# Altium footprint library iot_switch.PcbLib: 27 footprints (part 1 of 2)
Each footprint in its own frame and in the unit in brackets; x right, y up, seen from the top. Pads: shape width x height; smd on the part's side, far side on the other; paste and mask are expansions set on the pad; w line width, h text height; cw(c..) or ccw(c..) is an arc to the next point about the centre after c.
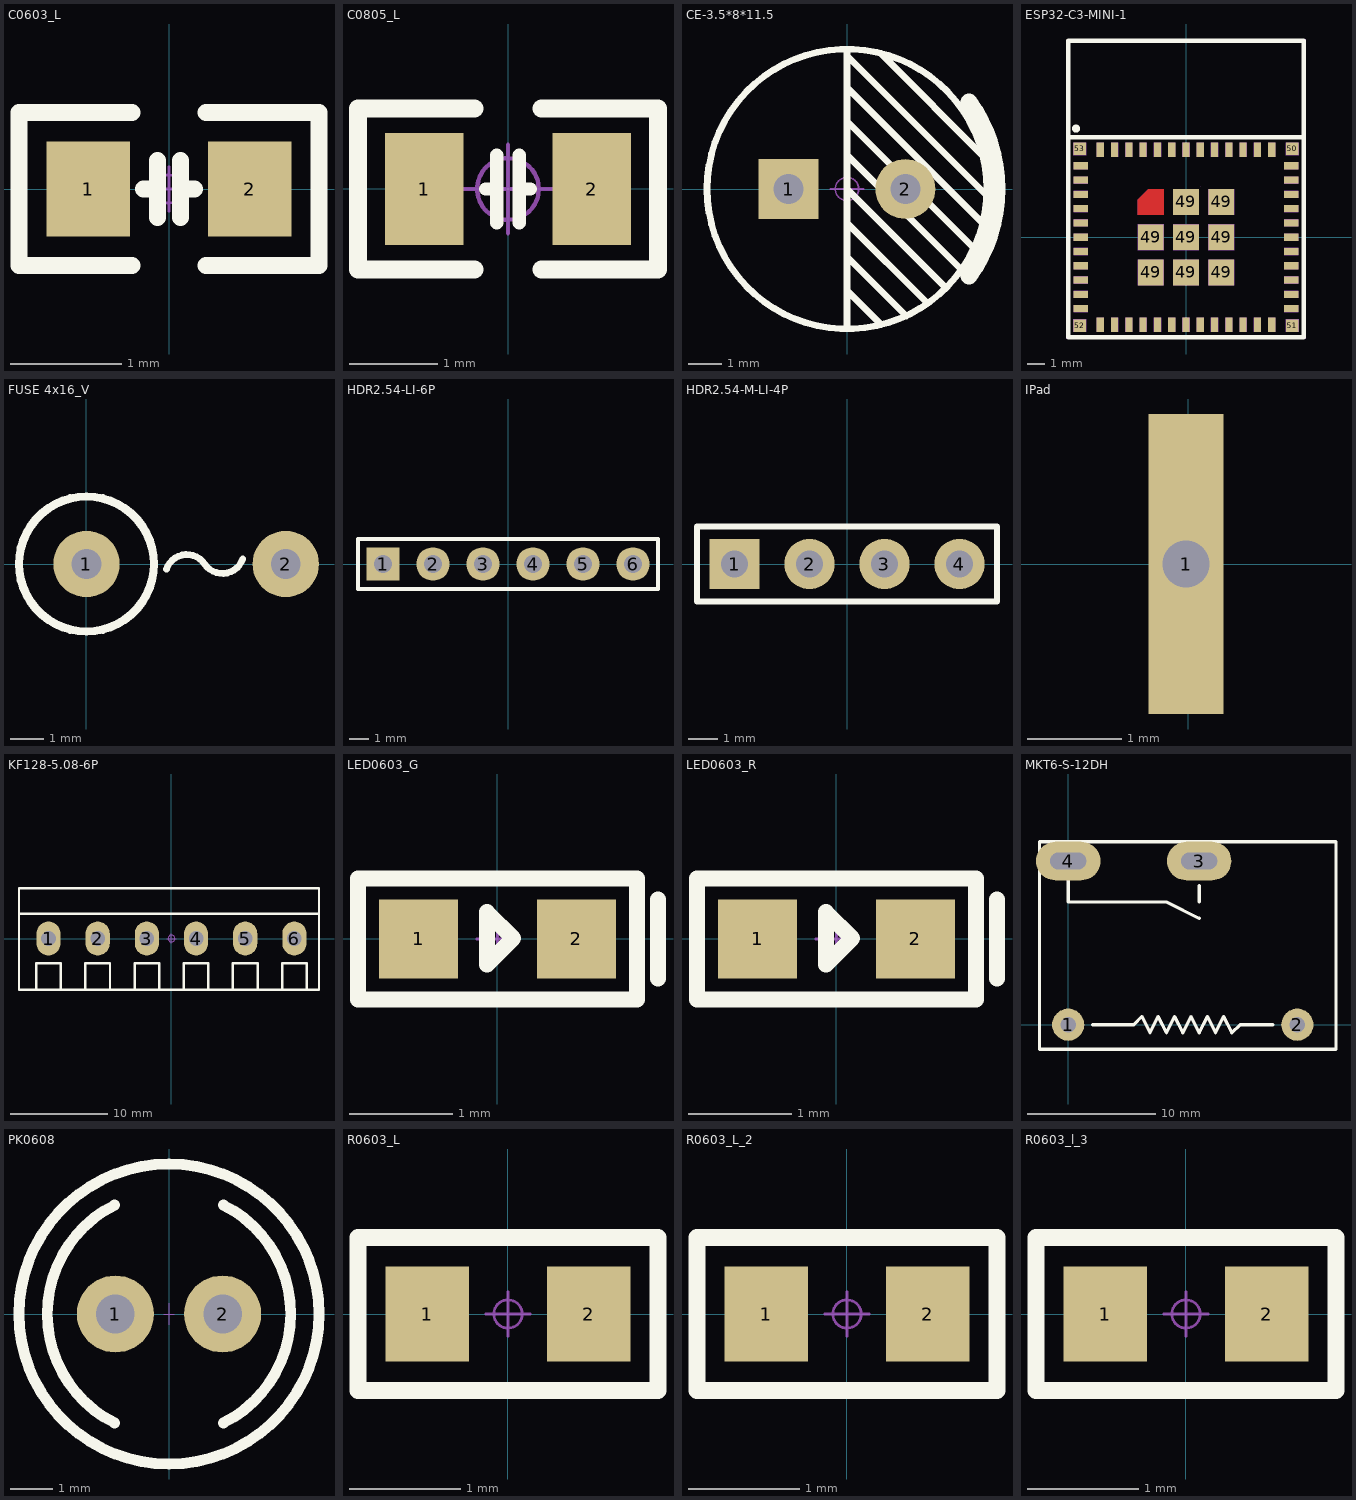
[diagram p0: the footprints below, top view; thin cyan lines are the x and y axes]

## C0603_L [mm] "贴片MLCC电容"
pads (2):
  rect 0.75x0.85 smd: 1(-0.725,0) 2(0.725,0)
Top Overlay:
  lines w0.152: -0.33,-0.686 -1.346,-0.686 -1.346,0.686 -0.33,0.686 ; -0.229,0 -0.102,0 ; -0.102,-0.254 -0.102,0.254 ; 0.102,-0.254 0.102,0.254 ; 0.102,0 0.229,0 ; 0.33,-0.686 1.346,-0.686 1.346,0.686 0.33,0.686
Mechanical 15:
  circle w0.025: c0,0 r0.127
  lines w0.025: -0.2,0 0.2,0 ; 0,-0.2 0,0.2
3D body "C0603H08-2S.stp": height 0.8, standoff 0, extent -0.8,-0.4 0.8,0.4

## C0805_L [mil] "贴片MLCC电容"
height 19.68
pads (2):
  rect 35x50 smd: 1(-37.4,0) 2(37.4,0)
Top Overlay:
  lines w6: -10,0 -5,0 ; -5,-15 -5,15 ; 5,-15 5,15 ; 5,0 10,0
  lines w8: -15,-36 -66.93,-36 -66.93,36 -15,36 ; 15,-36 66.93,-36 66.93,36 15,36
Mechanical 15:
  circle w1.97: c0,0 r13.78
  circle w1.97: c0,0 r13.78
  lines w1.97: -19.68,0 19.68,0 -19.68,0 ; 0,-19.68 0,19.68 0,-19.68
3D body "C0805H13-2S.stp": height 51.18, standoff -0.04, extent -39.37,-25.59 39.37,25.59

## CE-3.5*8*11.5 [mm] "脚距3.5mm直径8mm高度11.5mm       联系卖家 免费人工查找封装"
pads (2):
  rect 1.8x1.8 hole 0.9: 1(-1.75,0)
  round 1.8 hole 0.9: 2(1.75,0)
Top Overlay:
  circle w0.2: c0,0 r4.2
  lines w0.2: 0,-4.191 0,4 ; 0,-3.048 1.016,-4.064 ; 0,-2.032 1.778,-3.81 ; 0,-1.016 2.413,-3.429 ; 0,0 2.921,-2.921 ; 0,1.016 3.429,-2.413 ; 0,2.032 3.81,-1.778 ; 0,3.048 4.064,-1.016 ; 0,4.191 0,4 ; 1.016,4.064 4.191,0.889 ; 4.191,-0.127 4.127,-0.127 0,4
  lines w0.504: 3.663,-2.616 ccw(c0,0) 3.663,2.616
Mechanical 15:
  circle w0.05: c0,0 r0.35
  lines w0.05: -0.5,0 0.5,0 ; 0,-0.5 0,0.5
3D body "CE_TH_3.5x8x11.5.STEP": height 11.64, standoff -3.27, extent -4,-3.999 4.01,4

## ESP32-C3-MINI-1 [mm]
pads (60):
  rect 0.8x0.4 smd paste+0 mask+0.051: 1(-5.917,4.012) 2(-5.917,3.212) 3(-5.917,2.412) 4(-5.917,1.612) 5(-5.917,0.812) 6(-5.917,0.012) 7(-5.917,-0.788) 8(-5.917,-1.588) 9(-5.917,-2.388) 10(-5.917,-3.188) 11(-5.917,-3.988) 25(5.883,-3.988) 26(5.883,-3.188) 27(5.883,-2.388) 28(5.883,-1.588) 29(5.883,-0.788) 30(5.883,0.012) 31(5.883,0.812) 32(5.883,1.612) 33(5.883,2.412) 34(5.883,3.212) 35(5.883,4.012)
  rect 0.4x0.8 smd paste+0 mask+0.051: 12(-4.817,-4.888) 13(-4.017,-4.888) 14(-3.217,-4.888) 15(-2.417,-4.888) 16(-1.617,-4.888) 17(-0.817,-4.888) 18(-0.017,-4.888) 19(0.783,-4.888) 20(1.583,-4.888) 21(2.383,-4.888) 22(3.183,-4.888) 23(3.983,-4.888) 24(4.783,-4.888) 36(4.783,4.912) 37(3.983,4.912) 38(3.183,4.912) 39(2.383,4.912) 40(1.583,4.912) 41(0.783,4.912) 42(-0.017,4.912) 43(-0.817,4.912) 44(-1.617,4.912) 45(-2.417,4.912) 46(-3.217,4.912) 47(-4.017,4.912) 48(-4.817,4.912)
  rect 1.45x1.45 smd paste+0 mask+0.051: 49(-1.992,-1.963) 49(-1.992,0.012) 49(-0.017,-1.963) 49(-0.017,0.012) 49(-0.017,1.987) 49(1.958,-1.963) 49(1.958,0.012) 49(1.958,1.987)
  rect 0.7x0.7 smd paste+0 mask+0.051: 50(5.933,4.962) 51(5.933,-4.938) 52(-5.967,-4.938) 53(-5.967,4.962)
Top Layer:
  region: -2.717,2.112 -2.117,2.712 -1.267,2.712 -1.267,1.262 -2.717,1.262 -2.717,2.112
Top Overlay:
  lines w0.254: -6.617,5.612 6.583,5.612 ; -6.177,5.996 cw(c-6.172,6.096) -6.172,5.996 ; -6.617,-5.588 6.583,-5.588 6.583,11.012 -6.617,11.012 -6.617,-5.588
Mechanical 1:
  drawing of 68 lines, arcs and shapes, not listed
Mechanical 15:
  lines w0.003: 0.789,2.839 0.79,2.839
3D body "ESP32-C3-MINI-1 3D Model.STEP": height 2.4, standoff 0, extent -6.647,-5.563 6.553,11.037

## FUSE 4x16_V [mm] "4*16mm(直径，脚距）         淘宝ID:黄晶宝石"
pads (2):
  round 2 hole 0.9: 1(0,0) 2(6,0)
Top Overlay:
  circle w0.254: c0,0 r2.032
  lines w0.203: 2.406,-0.156 cw(c3.019,-0.362) 3.556,0 ccw(c4.093,0.362) 4.706,0.156
3D body "FU_4x16_v.STEP": height 13.1, standoff -3.5, extent -2,-1.997 6.3,1.997

## HDR2.54-LI-6P [mm] "排针，6脚                        联系卖家 免费查找封装"
pads (6):
  rect 1.7x1.7 hole 0.9: 1(-6.35,0)
  round 1.7 hole 0.9: 2(-3.81,0) 3(-1.27,0) 4(1.27,0) 5(3.81,0) 6(6.35,0)
Top Overlay:
  lines w0.2: -7.62,-1.27 7.62,-1.27 7.62,1.27 -7.62,1.27 -7.62,-1.27
3D body "HDR2.54-1P.STEP": height 2.54, standoff -8.96, extent -7.62,-1.27 -5.08,1.27
3D body "HDR2.54-1P.STEP": height 2.54, standoff -8.96, extent -5.08,-1.27 -2.54,1.27
3D body "HDR2.54-1P.STEP": height 2.54, standoff -8.96, extent -2.54,-1.27 0,1.27
3D body "HDR2.54-1P.STEP": height 2.54, standoff -8.96, extent 0,-1.27 2.54,1.27
3D body "HDR2.54-1P.STEP": height 2.54, standoff -8.96, extent 2.54,-1.27 5.08,1.27
3D body "HDR2.54-1P.STEP": height 2.54, standoff -8.96, extent 5.08,-1.27 7.62,1.27

## HDR2.54-M-LI-4P [mm] "排母，4脚"
pads (4):
  rect 1.7x1.7 hole 0.9: 1(-3.81,0)
  round 1.7 hole 0.9: 2(-1.27,0) 3(1.27,0) 4(3.81,0)
Top Overlay:
  lines w0.2: -5.08,-1.27 5.08,-1.27 5.08,1.27 -5.08,1.27 -5.08,-1.27
3D body "HDR2.54-1P_M.STEP": height 8.5, standoff -3, extent -2.54,-1.27 0,1.27
3D body "HDR2.54-1P_M.STEP": height 8.5, standoff -3, extent -5.08,-1.27 -2.54,1.27
3D body "HDR2.54-1P_M.STEP": height 8.5, standoff -3, extent 2.54,-1.27 5.08,1.27
3D body "HDR2.54-1P_M.STEP": height 8.5, standoff -3, extent 0,-1.27 2.54,1.27

## IPad [mm]
height 1.8
pads (1):
  rect 0.8x3.2 hole 0.5 square: 1(-0.025,0)

## KF128-5.08-6P [mm] "螺钉式接线端子，脚距5.08mm"
pads (6):
  oval 2.5x3.5 hole 1.5: 1(-12.7,0) 2(-7.62,0) 3(-2.54,0) 4(2.54,0) 5(7.62,0) 6(12.7,0)
Top Overlay:
  lines w0.254: -15.748,2.54 15.24,2.54 ; -13.97,-5.309 -13.97,-2.54 -11.43,-2.54 -11.43,-5.309 ; -8.89,-5.309 -8.89,-2.54 -6.35,-2.54 -6.35,-5.309 ; -3.81,-5.309 -3.81,-2.54 -1.27,-2.54 -1.27,-5.309 ; 1.27,-5.309 1.27,-2.54 3.81,-2.54 3.81,-5.309 ; 6.35,-5.309 6.35,-2.54 8.89,-2.54 8.89,-5.309 ; 11.43,-5.309 11.43,-2.54 13.97,-2.54 13.97,-5.309 ; -15.748,-5.309 -15.748,5.207 15.24,5.207 15.24,-5.309 -15.748,-5.309
Mechanical 15:
  circle w0.05: c0,0 r0.35
  lines w0.05: -0.5,0 0.5,0 ; 0,-0.5 0,0.5
3D body "KF128-5.08.STEP": height 14.18, standoff -3.92, extent 9.66,-5.3 15.24,5.2
3D body "KF128-5.08.STEP": height 14.18, standoff -3.92, extent 4.58,-5.3 10.16,5.2
3D body "KF128-5.08.STEP": height 14.18, standoff -3.92, extent -0.5,-5.3 5.08,5.2
3D body "KF128-5.08.STEP": height 14.18, standoff -3.92, extent -5.58,-5.3 0,5.2
3D body "KF128-5.08.STEP": height 14.18, standoff -3.92, extent -10.66,-5.3 -5.08,5.2
3D body "KF128-5.08.STEP": height 14.18, standoff -3.92, extent -15.74,-5.3 -10.16,5.2

## LED0603_G [mil] "绿色0603LED"
pads (2):
  rect 30x30 smd: 1(-30,0) 2(30,0)
Top Overlay:
  lines w6: 61,-15 61,15 ; -53,-23 -53,23 53,23 53,-23 -53,-23 ; -4,-9.75 6,0.25 -4,10.25 -4,-9.75
Mechanical 15:
  circle w1: c0,0 r5
  lines w1: -7.87,0 7.87,0 ; 0,-7.87 0,7.87
3D body "LED_0603-G(1).STEP": height 18.36, standoff -0.04, extent -31.5,-15.79 31.5,15.79
3D body "LED 0603玻璃罩.": height 0, standoff 0, extent 0,0 0,0

## LED0603_R [mil] "红色0603LED"
pads (2):
  rect 30x30 smd: 1(-30,0) 2(30,0)
Top Overlay:
  lines w6: 61,-15 61,15 ; -53,-23 53,-23 53,23 -53,23 -53,-23 ; -4,-9.75 -4,10.25 6,0.25 -4,-9.75
Mechanical 15:
  circle w1: c0,0 r5
  lines w1: -7.88,0 7.87,0 ; 0,-7.88 0,7.87
3D body "LED 0603玻璃罩.": height 0, standoff 0, extent 0,0 0,0
3D body "LED_0603-R.STEP": height 18.36, standoff -0.04, extent -31.49,-15.78 31.5,15.8

## MKT6-S-12DH [mm] "单刀单投/常开"
pads (4):
  round 2.5 hole 1.2: 1(0,0) 2(17.78,0)
  oval 5x3 hole 1.3 slot 2.8 at 0 deg: 3(10.16,12.7) 4(0,12.7)
Top Overlay:
  lines w0.254: 0,11.43 0,9.525 6.985,9.525 7.62,9.525 10.16,8.255 ; 1.905,0 5.08,0 5.715,0.635 6.35,-0.635 6.985,0.635 7.62,-0.635 8.255,0.635 8.89,-0.635 9.525,0.635 10.16,-0.635 10.795,0.635 11.43,-0.635 12.065,0.635 12.7,-0.635 13.335,0 15.875,0 ; 10.16,9.525 10.16,10.795 ; -2.22,-1.9 -2.22,14.2 20.78,14.2 20.78,-1.9 -2.22,-1.9
3D body "MKtT-S-12DH.STEP": height 10.25, standoff -3.85, extent -2.24,-1.9 20.76,14.2

## PK0608 [mm] "2.5*7*10mm(脚距，直径，高）"
pads (2):
  round 1.8 hole 0.9: 1(-1.25,0) 2(1.25,0)
Top Overlay:
  circle w0.254: c0,0 r3.5
  lines w0.254: -1.27,-2.54 cw(c0,0) -1.27,2.54 ; 1.27,-2.54 ccw(c0,0) 1.27,2.54
Mechanical 15:
  lines w0.01: -0.127,0 0.127,0 ; 0,-0.254 0,0.254
3D body "PK0608.STEP": height 10.02, standoff -2.78, extent -3.5,-3.5 3.5,3.5

## R0603_L [mm] "1/10W贴片电阻"
height 1.8
pads (2):
  rect 0.75x0.85 smd: 1(-0.725,0) 2(0.725,0)
Top Overlay:
  lines w0.152: -1.346,-0.686 1.346,-0.686 1.346,0.686 -1.346,0.686 -1.346,-0.686
Mechanical 15:
  circle w0.025: c0,0 r0.127
  lines w0.025: -0.2,0 0.2,0 ; 0,-0.2 0,0.2
3D body "R0603-2.stp": height 0.4, standoff 0, extent -0.8,-0.4 0.8,0.4

## R0603_L_2 [mm]
pads (2):
  rect 0.75x0.85 smd: 1(-0.725,0) 2(0.725,0)
Top Overlay:
  lines w0.152: -1.346,-0.686 -1.346,0.686 1.346,0.686 1.346,-0.686 -1.346,-0.686
Mechanical 15:
  circle w0.025: c0,0 r0.127
  lines w0.025: -0.2,0 0.2,0 ; 0,-0.2 0,0.2
3D body "R0603-2.stp": height 0.4, standoff 0, extent -0.8,-0.4 0.8,0.4

## R0603_l_3 [mm]
pads (2):
  rect 0.75x0.85 smd: 1(-0.725,0) 2(0.725,0)
Top Overlay:
  lines w0.152: -1.346,-0.686 1.346,-0.686 1.346,0.686 -1.346,0.686 -1.346,-0.686
Mechanical 15:
  circle w0.025: c0,0 r0.127
  lines w0.025: -0.2,0 0.2,0 ; 0,-0.2 0,0.2
3D body "R0603-2.stp": height 0.4, standoff 0, extent -0.8,-0.4 0.8,0.4